# Altium footprint library thu vien thong.PcbLib: 106 footprints (part 5 of 7)
Each footprint in its own frame and in the unit in brackets; x right, y up, seen from the top. Pads: shape width x height; smd on the part's side, far side on the other; paste and mask are expansions set on the pad; w line width, h text height; cw(c..) or ccw(c..) is an arc to the next point about the centre after c.
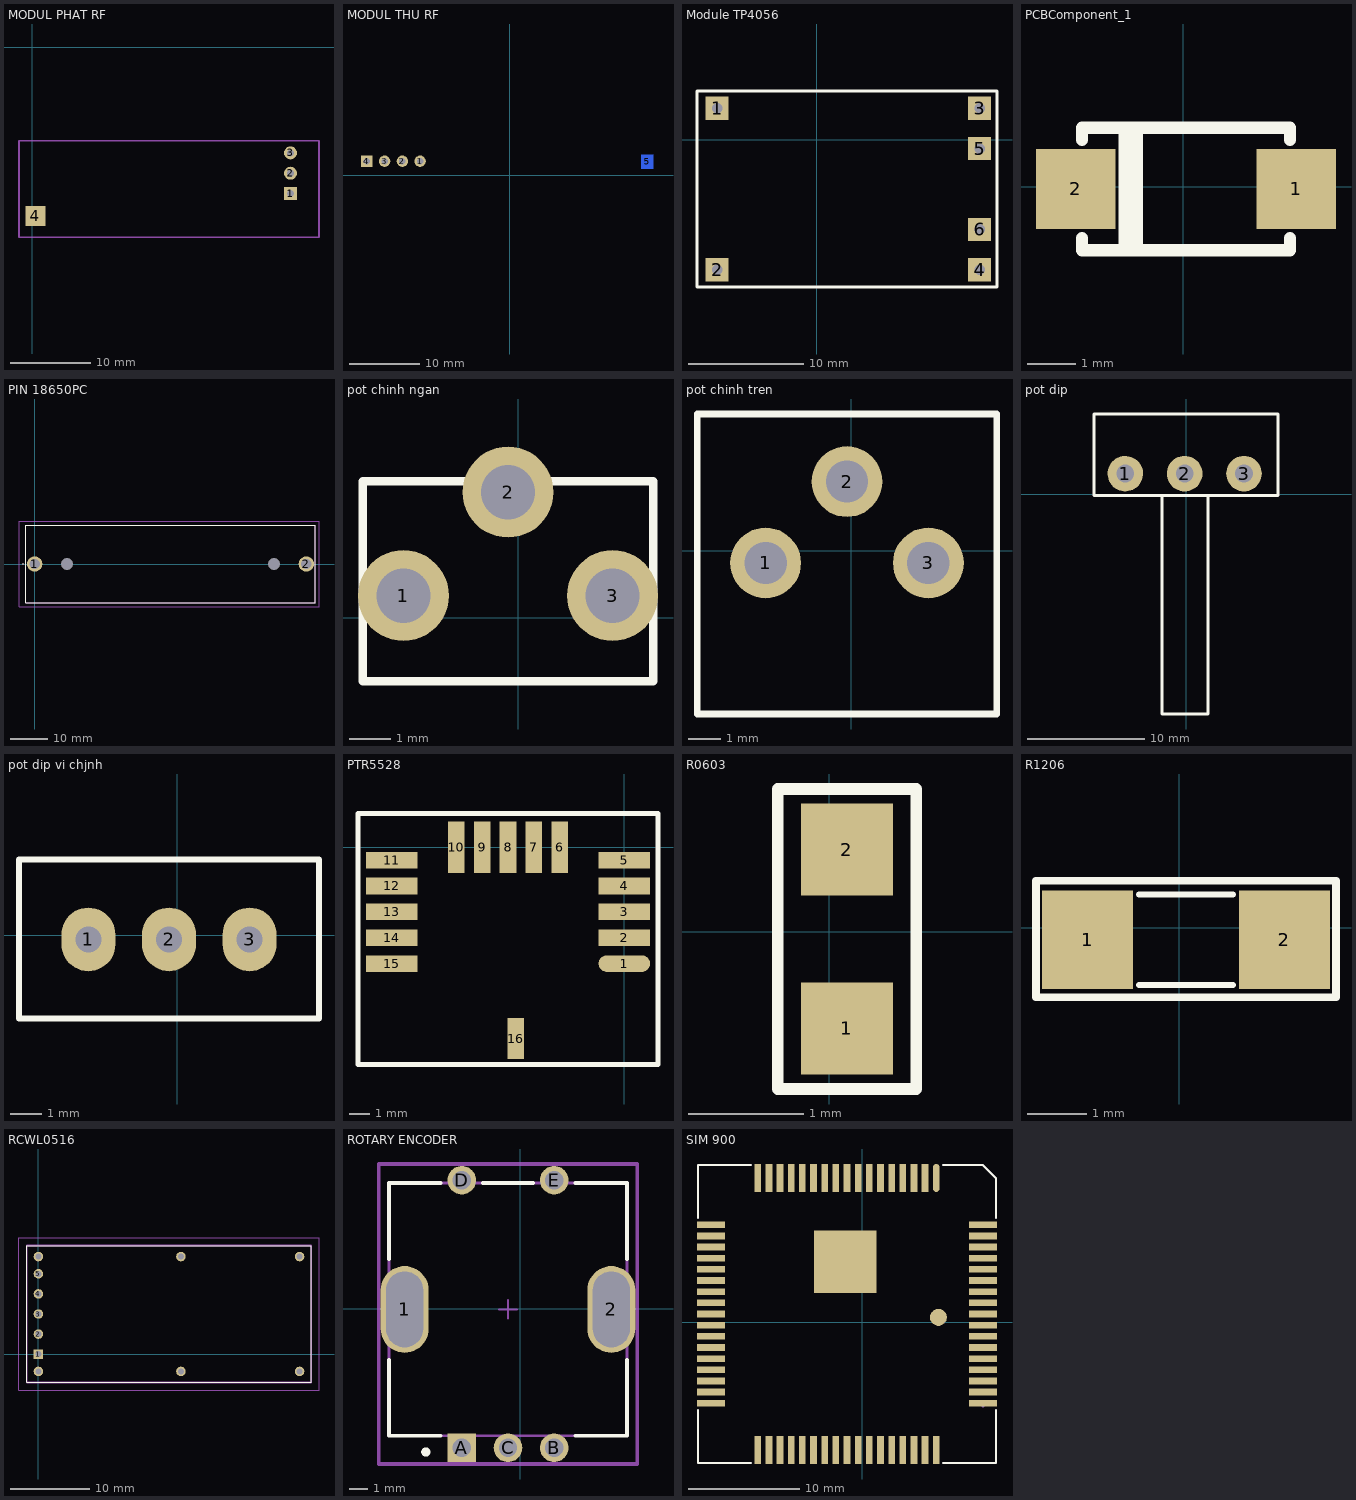
[diagram p4: the footprints below, top view; thin cyan lines are the x and y axes]

## MODUL PHAT RF [mil]
pads (4):
  rect 64x64 hole 35.43: 1(1270,-720)
  round 64 hole 35.43: 2(1270,-620) 3(1270,-520)
  rect 98.43x98.43 smd: 4(15,-830)
Bottom Overlay:
  lines w7.87: -65,-935 1410,-935 1410,-460 -65,-460 -65,-935
  text "." at 1275,-625 h39.37
Mechanical 13:
  lines w7.87: -65,-935 1410,-935 1410,-460 -65,-460 -65,-935
3D body: height 350, standoff -100, extent 1260,-530 1280,-510
3D body: height 350, standoff -100, extent 1260,-630 1280,-610
3D body: height 350, standoff -100, extent 1260,-730 1280,-710

## MODUL THU RF [mil]
pads (5):
  round 64 hole 35.43: 1(-505,80) 2(-605,80) 3(-705,80)
  rect 64x64 hole 35.43: 4(-805,80)
  rect 67x79 smd far side: 5(774,76)
Bottom Overlay:
  lines w7.87: -855,-298 835,-298 835,145 -855,145 -855,-298
3D body: height 350, standoff -100, extent -815,70 -795,90
3D body: height 350, standoff -100, extent -715,70 -695,90
3D body: height 350, standoff -100, extent -615,70 -595,90
3D body: height 350, standoff -100, extent -515,70 -495,90

## Module TP4056 [mm]
pads (6):
  rect 2x2 hole 0.914: 1(-8.615,2.713) 2(-8.615,-11.287) 3(14.135,2.713) 4(14.135,-11.287) 5(14.135,-0.787) 6(14.135,-7.787)
Top Overlay:
  lines w0.254: -10.365,-12.787 -10.365,4.213 15.635,4.213 15.635,-12.787 -10.365,-12.787
Mechanical 15:
  text "TP4056" at -4.523,-6.328 h2.03
  text "OUT+" at 5.129,0.53 h2.03
  text "B+" at 9.066,-2.645 h2.03
  text "B-" at 8.685,-9.757 h2.03
  text "OUT-" at 4.875,-13.059 h2.03
  text "In-" at -6.581,-13.02 h2.03
  text "In+" at -6.428,0.403 h2.03
3D body "TP4056 Charger Module.step": height 4.13, standoff -7.33, extent -12.51,-13.95 14.3,5.25

## PCBComponent_1 [mil]
pads (2):
  rect 65x65 smd: 1(92.32,-1.73) 2(-87.68,-1.73)
Top Overlay:
  region: -32.67,48.26 -52.67,48.26 -52.67,-51.74 -32.67,-51.74
  lines w10: -82.68,-41.73 -82.68,-51.73 87.32,-51.73 87.32,-41.73 ; -82.68,38.27 -82.68,48.27 87.32,48.27 87.32,38.27
3D body "SW3dPS-DO-214AC SMA.STEP": height 95.28, standoff 0.6, extent -100.04,-52.91 104.68,49.45

## PCBComponent_1 - duplicate [mm]

## PIN 18650PC [mm]
pads (4):
  round 4.155 hole 2.77: 1(0,0) 2(72.9,0)
  round 1.6 hole 3.2 unplated: MH1(8.645,0) MH2(64.255,0)
Top Overlay:
  lines w0.1: -2.4,-10.45 75.3,-10.45 75.3,10.45 -2.4,10.45 -2.4,-10.45
  lines w0.2: -3.2,0 ccw(c-3.15,0) -3.1,0 ; -3.2,0 cw(c-3.15,0) -3.1,0 ; -3.2,0 ccw(c-3.15,0) -3.1,0
Mechanical 13:
  lines w0.2: -2.4,-10.45 75.3,-10.45 75.3,10.45 -2.4,10.45 -2.4,-10.45
Mechanical 15:
  lines w0.1: -4.2,-11.45 76.3,-11.45 76.3,11.45 -4.2,11.45 -4.2,-11.45
3D body "BH-18650-PC.stp": height 21.71, standoff -2.9, extent -2.35,-10.45 75.35,10.45

## pot chinh ngan [mil]
pads (3):
  round 87 hole 52: 1(-110,21) 2(-10,120) 3(90,21)
Top Overlay:
  lines w8: -149,-61 129,-61 129,130.5 -149,130.5 -149,-61
3D body "User Library-POT-3306W.step": height 330.71, standoff -75, extent -144.05,-57.16 124.06,125.91

## pot chinh tren [mil]
pads (3):
  round 87 hole 52: 1(-105,-15) 2(-5,85) 3(95,-15)
Top Overlay:
  lines w8: -189,-200.5 179,-200.5 179,168 -189,168 -189,-200.5
3D body "SW3DPS-CERMET TRIMMER SINGLE TURN 10MM 500MW TOP ADJUST-DEFAULT.STEP": height 300, standoff -87.01, extent -192.6,-204.2 182.6,171

## pot dip [mil]
pads (3):
  round 120 hole 60: 1(-205,70) 2(-5,70) 3(195,70)
Top Overlay:
  lines w10: -82,-3 -82,-740 74,-740 74,-3 ; -310,-3 309,-3 309,271 -310,271 -310,-3
3D body "POT2.STEP": height 811.87, standoff -157.48, extent -313,-738.11 307,268.11

## pot dip vi chjnh [mil]
pads (3):
  oval 67x79 hole 32: 1(-110,-5) 2(-10,-5) 3(90,-5)
Top Overlay:
  lines w7.87: -196,-103 176,-103 176,94 -196,94 -196,-103
3D body "User Library-Potenciometro Vertical.step": height 474.25, standoff -214.73, extent -191.1,-99 171.1,89.98

## PTR5528 [mil] "https://vi.aliexpress.com/item/1705429590.html"
height 100
pads (16):
  oval 100x32 smd: 1(0,-225)
  rect 100x32 smd: 2(0,-175) 3(0,-125) 4(0,-75) 5(0,-25) 11(-450,-25) 12(-450,-75) 13(-450,-125) 14(-450,-175) 15(-450,-225)
  rect 32x100 smd: 6(-125,0) 7(-175,0) 8(-225,0) 9(-275,0) 10(-325,0)
  rect 32x78.74 smd: 16(-210,-370.08)
Top Overlay:
  lines w10: -515,-420 -515,65 65,65 65,-420 -515,-420

## R0603 [mm]
pads (2):
  rect 0.8x0.8 smd: 1(0.152,-0.839) 2(0.152,0.711)
Top Overlay:
  lines w0.1: -0.448,-1.364 -0.448,1.236 0.752,1.236 0.752,-1.364 -0.448,-1.364
3D body "Res0603.STEP": height 0.45, standoff 0, extent -0.273,-0.839 0.577,0.711

## R1206 [mil]
pads (2):
  rect 60x65 smd: 1(-60.58,-8.06) 2(69.42,-8.06)
Top Overlay:
  lines w4: -26.58,-38.06 35.42,-38.06 ; -26.58,21.94 35.42,21.94
  lines w5: -94.58,-46.06 103.42,-46.06 103.42,30.94 -94.58,30.94 -94.58,-46.06
3D body "1206 SMD Resistor.step": height 40.05, standoff 0.6, extent -58.57,-39.55 67.42,23.45

## RCWL0516 [mm]
pads (11):
  rect 1.2x1.2 hole 0.75: 1(0,0)
  round 1.2 hole 0.75: 2(0,2.54) 3(0,5.08) 4(0,7.62) 5(0,10.16) MH1(0,-2.17) MH2(0,12.33) MH3(18,12.33) MH4(18,-2.17) MH5(33,-2.17) MH6(33,12.33)
Top Overlay:
  lines w0.1: -1.45,-3.57 -1.45,13.73 34.45,13.73 34.45,-3.57 -1.45,-3.57
Mechanical 13:
  lines w0.2: -1.45,-3.57 -1.45,13.73 34.45,13.73 34.45,-3.57 -1.45,-3.57
Mechanical 15:
  lines w0.1: -2.45,-4.57 -2.45,14.73 35.45,14.73 35.45,-4.57 -2.45,-4.57
3D body "RCWL-0516.stp": height 5.1, standoff -5, extent -1.45,-3.57 34.45,13.73

## ROTARY ENCODER [mm]
pads (7):
  oval 2.6x4.7 hole 4.1 slot 2 at 0 deg paste-1000 mask+0: 1(-6.265,-0.025) 2(4.935,-0.025)
  rect 1.55x1.55 hole 1 paste-1000 mask+0: A(-3.165,-7.525)
  round 1.55 hole 1 paste-1000 mask+0: B(1.835,-7.525) C(-0.665,-7.525) D(-3.165,6.975) E(1.835,6.975)
Top Overlay:
  circle w0.25: c-5.115,-7.75 r0.125
  lines w0.2: -7.115,-2.75 -7.115,-6.875 -4.315,-6.875 ; -7.115,2.7 -7.115,6.825 -4.315,6.825 ; -2.015,6.825 0.685,6.825 ; 2.985,-6.875 5.785,-6.875 5.785,-2.75 ; 2.985,6.825 5.785,6.825 5.785,2.7
Mechanical 10:
  lines w0.2: -7.665,-8.4 -7.665,7.85 6.335,7.85 6.335,-8.4 -7.665,-8.4
  text ".Designator" at -0.665,-0.275 h1
Mechanical 12:
  lines w0.15: -7.115,-6.875 -7.115,6.825 5.785,6.825 5.785,-6.875 -7.115,-6.875
Mechanical 15:
  lines w0.1: -1.165,-0.025 -0.165,-0.025 ; -0.665,-0.525 -0.665,0.475
  lines w0.2: -7.665,-8.4 -7.665,7.85 6.335,7.85 6.335,-8.4 -7.665,-8.4
3D body "Enc_ALPS_EC12E2424407_eec.STEP": height 0.25, standoff 0, extent -7.665,-8.4 6.335,7.85

## SIM 900 [mm]
pads (70):
  oval 0.6x2.5 smd: 1(6.653,12.952)
  rect 0.6x2.5 smd: 2(5.653,12.952) 3(4.653,12.952) 4(3.653,12.952) 5(2.653,12.952) 6(1.653,12.952) 7(0.653,12.952) 8(-0.347,12.952) 9(-1.347,12.952) 10(-2.347,12.952) 11(-3.347,12.952) 12(-4.347,12.952) 13(-5.347,12.952) 14(-6.347,12.952) 15(-7.347,12.952) 16(-8.347,12.952) 17(-9.347,12.952) 35(-9.347,-11.448) 36(-8.347,-11.448) 37(-7.347,-11.448) 38(-6.347,-11.448) 39(-5.347,-11.448) 40(-4.347,-11.448) 41(-3.347,-11.448) 42(-2.347,-11.448) 43(-1.347,-11.448) 44(-0.347,-11.448) 45(0.653,-11.448) 46(1.653,-11.448) 47(2.653,-11.448) 48(3.653,-11.448) 49(4.653,-11.448) 50(5.653,-11.448) 51(6.653,-11.448)
  rect 2.5x0.6 smd: 18(-13.547,8.752) 19(-13.547,7.752) 20(-13.547,6.752) 21(-13.547,5.752) 22(-13.547,4.752) 23(-13.547,3.752) 24(-13.547,2.752) 25(-13.547,1.752) 26(-13.547,0.752) 27(-13.547,-0.248) 28(-13.547,-1.248) 29(-13.547,-2.248) 30(-13.547,-3.248) 31(-13.547,-4.248) 32(-13.547,-5.248) 33(-13.547,-6.248) 34(-13.547,-7.248) 52(10.853,-7.248) 53(10.853,-6.248) 54(10.853,-5.248) 55(10.853,-4.248) 56(10.853,-3.248) 57(10.853,-2.248) 58(10.853,-1.248) 59(10.853,-0.248) 60(10.853,0.752) 61(10.853,1.752) 62(10.853,2.752) 63(10.853,3.752) 64(10.853,4.752) 65(10.853,5.752) 66(10.853,6.752) 67(10.853,7.752) 68(10.853,8.752)
  rect 5.6x5.6 smd: ""(-1.497,5.422)
  round 1.524 smd: ""(6.853,0.452)
Top Overlay:
  lines w0.2: -14.697,-7.848 -14.697,-12.598 -9.947,-12.598 ; -14.697,9.352 -14.697,14.102 -9.947,14.102 ; 7.253,-12.598 12.003,-12.598 12.003,-7.848 ; 7.253,14.102 10.853,14.102 12.003,12.952 12.003,9.352
Mechanical 1:
  lines w0.254: 10.828,-7.498 10.853,-7.523
3D body: height 2, standoff 0.1, extent -13.547,-11.548 10.978,13.427